# Altium footprint library BeaconBoard.PcbLib: 39 footprints (part 3 of 3)
Each footprint in its own frame and in the unit in brackets; x right, y up, seen from the top. Pads: shape width x height; smd on the part's side, far side on the other; paste and mask are expansions set on the pad; w line width, h text height; cw(c..) or ccw(c..) is an arc to the next point about the centre after c.
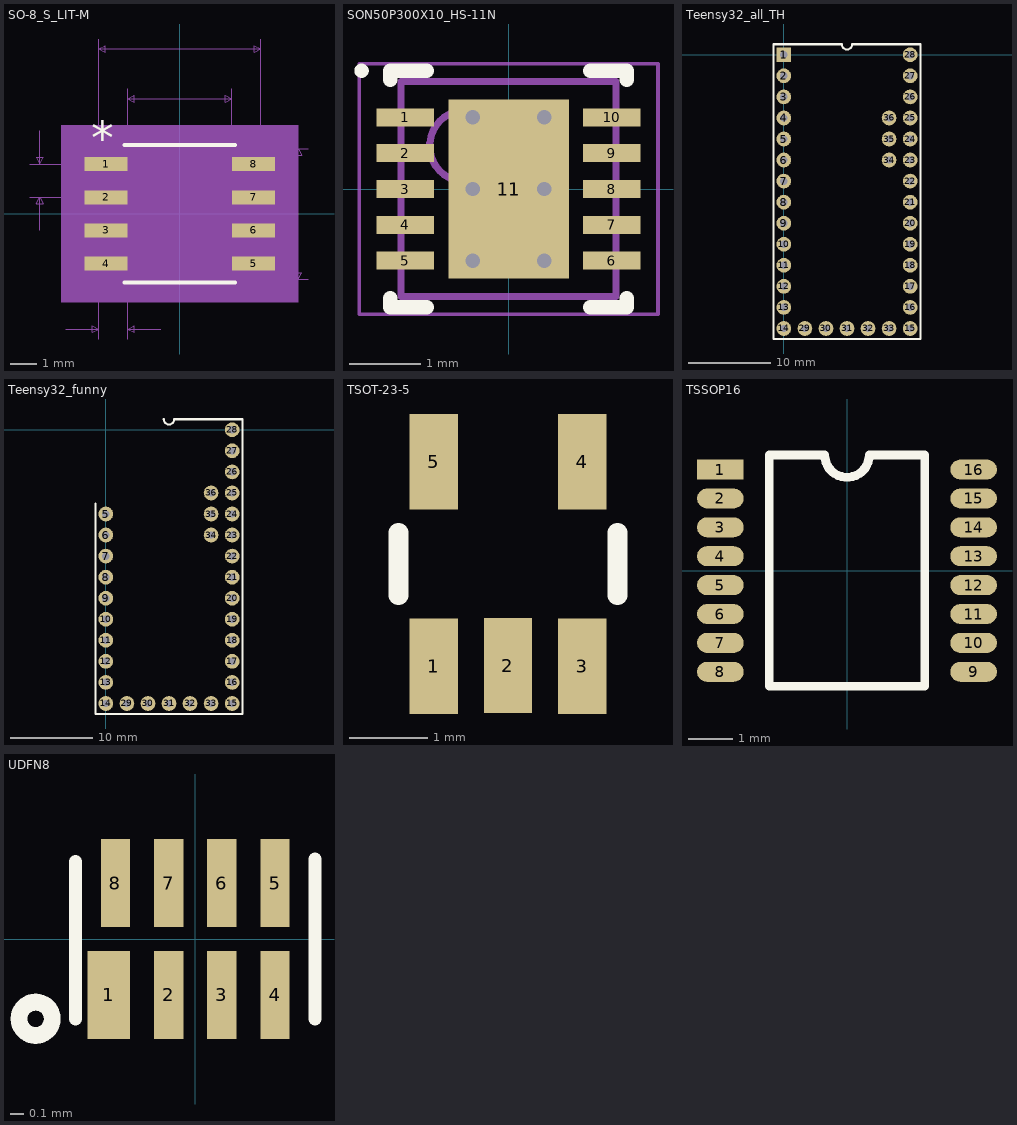
[diagram p2: the footprints below, top view; thin cyan lines are the x and y axes]

## SO-8_S_LIT-M [mm]
pads (8):
  rect 1.655x0.533 smd paste+0 mask+0: 1(-2.821,1.905) 2(-2.821,0.635) 3(-2.821,-0.635) 4(-2.821,-1.905) 5(2.821,-1.905) 6(2.821,-0.635) 7(2.821,0.635) 8(2.821,1.905)
Top Overlay:
  lines w0.152: -2.121,-2.629 2.121,-2.629 ; -2.121,2.629 2.121,2.629
  text "*" at -3.393,2.311 h1.27
Mechanical 5:
  region: 4.538,-3.391 -4.538,-3.391 -4.538,3.391 4.538,3.391
Mechanical 7:
  lines w0.025: -5.742,0.635 -2.821,0.635 ; -5.742,1.905 -2.821,1.905 ; -5.361,-0.635 -5.361,0.635 ; -5.361,3.175 -5.361,1.905 ; -4.369,-4.407 -3.099,-4.407 ; -3.099,-4.788 -3.099,0 -3.099,6.693 ; -1.994,-4.788 -1.994,0 -1.994,4.788 ; -0.724,-4.407 -1.994,-4.407 ; 0,-2.502 4.915,-2.502 ; 0,2.502 4.915,2.502 ; 1.994,0 1.994,4.788 ; 3.099,0 3.099,6.693 ; -5.361,0.635 -5.234,0.381 -5.488,0.381 -5.361,0.635 ; -5.361,1.905 -5.234,2.159 -5.488,2.159 -5.361,1.905 ; -3.099,-4.407 -3.353,-4.534 -3.353,-4.28 -3.099,-4.407 ; -3.099,6.312 -2.845,6.185 -2.845,6.439 -3.099,6.312 ; -3.099,6.312 3.099,6.312 ; -1.994,-4.407 -1.74,-4.534 -1.74,-4.28 -1.994,-4.407 ; -1.994,4.407 -1.74,4.28 -1.74,4.534 -1.994,4.407 ; -1.994,4.407 1.994,4.407 ; 1.994,4.407 1.74,4.28 1.74,4.534 1.994,4.407 ; 3.099,6.312 2.845,6.185 2.845,6.439 3.099,6.312 ; 4.534,-2.502 4.661,-2.248 4.407,-2.248 4.534,-2.502 ; 4.534,-2.502 4.534,2.502 ; 4.534,2.502 4.661,2.248 4.407,2.248 4.534,2.502
  text "0.05in/1.27mm" at -4.61,-5.55 h0.64
  text "0.05in/1.27mm" at -9.997,0.953 h0.64
  text "0.197in/5.004mm" at 5.042,-0.318 h0.64
  text "0.244in/6.198mm" at -2.381,6.82 h0.64
  text "0.157in/3.988mm" at -2.381,4.915 h0.64
  text "Alt 2 Padstyle: b229_152h76" at -8.572,-15.202 h1.27
  text "Alt 1 Padstyle: b152_229h76" at -8.572,-13.678 h1.27
  text "Pin One Padstyle: r165_53" at -7.938,-9.106 h1.27
  text "Default Padstyle: r165_53" at -7.938,-7.582 h1.27
Mechanical 13:
  lines w0: -0.305,2.502 ccw(c0,2.502) 0.305,2.502
  lines w0.025: -3.099,-2.146 -1.994,-2.146 -1.994,-1.664 -3.099,-1.664 -3.099,-2.146 ; -3.099,-0.876 -1.994,-0.876 -1.994,-0.394 -3.099,-0.394 -3.099,-0.876 ; -3.099,0.394 -1.994,0.394 -1.994,0.876 -3.099,0.876 -3.099,0.394 ; -3.099,1.664 -1.994,1.664 -1.994,2.146 -3.099,2.146 -3.099,1.664 ; -1.994,-2.502 -1.994,2.502 1.994,2.502 1.994,-2.502 -1.994,-2.502 ; 1.994,-2.146 3.099,-2.146 3.099,-1.664 1.994,-1.664 1.994,-2.146 ; 1.994,-0.876 3.099,-0.876 3.099,-0.394 1.994,-0.394 1.994,-0.876 ; 1.994,0.394 3.099,0.394 3.099,0.876 1.994,0.876 1.994,0.394 ; 1.994,1.664 3.099,1.664 3.099,2.146 1.994,2.146 1.994,1.664
  text "*" at -1.93,1.156 h1.27
Mechanical 15:
  region: -2.502,-2.679 -4.157,-2.679 -4.157,2.679 -2.502,2.679 -2.502,3.01 2.502,3.01 2.502,2.679 4.157,2.679 4.157,-2.679 2.502,-2.679 2.502,-3.01 -2.502,-3.01
  lines w0.152: -4.157,-2.679 -2.502,-2.679 -2.502,-3.01 2.502,-3.01 2.502,-2.679 4.157,-2.679 4.157,2.679 2.502,2.679 2.502,3.01 -2.502,3.01 -2.502,2.679 -4.157,2.679 -4.157,-2.679
3D body "SO-8_S_LIT.step": height 1.76, standoff 0, extent -3.099,-2.502 3.099,2.502
3D body: height 0.25, standoff 0, extent 0,0 0.254,0.254

## SON50P300X10_HS-11N [mm] "SON, 10-Leads, Body 3.00x3.00mm, Pitch 0.50mm, Thermal Pad 2.50x1.68mm, IPC Medium Density"
height 0.1
pads (11):
  rect 0.8x0.25 smd: 1(-1.44,1) 2(-1.44,0.5) 3(-1.44,0) 4(-1.44,-0.5) 5(-1.44,-1) 6(1.44,-1) 7(1.44,-0.5) 8(1.44,0) 9(1.44,0.5) 10(1.44,1)
  rect 1.68x2.5 smd: 11(0,0)
via 0.5,-1 diameter 0.5 hole 0.2
via -0.5,-1 diameter 0.5 hole 0.2
via 0.5,0 diameter 0.5 hole 0.2
via -0.5,0 diameter 0.5 hole 0.2
via 0.5,1 diameter 0.5 hole 0.2
via -0.5,1 diameter 0.5 hole 0.2
Top Overlay:
  circle w0.1: c-2.05,1.65 r0.05
  lines w0.2: -1.65,-1.525 -1.65,-1.65 -1.14,-1.65 ; -1.65,1.525 -1.65,1.65 -1.14,1.65 ; 1.14,-1.65 1.65,-1.65 1.65,-1.525 ; 1.14,1.65 1.65,1.65 1.65,1.525
Mechanical 13:
  circle w0.1: c-0.6,0.6 r0.5
  lines w0.1: -1.5,-1.5 1.5,-1.5 1.5,1.5 -1.5,1.5 -1.5,-1.5
Mechanical 15:
  lines w0.05: -2.085,-1.75 2.085,-1.75 2.085,1.75 -2.085,1.75 -2.085,-1.75
  lines w0.1: -0.5,0 0.5,0 ; 0,-0.5 0,0.5
3D body: height 0.75, standoff 0.05, extent -1.5,-1.5 1.5,1.5

## Teensy32_all_TH [mil]
pads (36):
  rect 70x70 hole 35: 1(0,0)
  round 70 hole 35: 2(0,-100) 3(0,-200) 4(0,-300) 5(0,-400) 6(0,-500) 7(0,-600) 8(0,-700) 9(0,-800) 10(0,-900) 11(0,-1000) 12(0,-1100) 13(0,-1200) 14(0,-1300) 15(600,-1300) 16(600,-1200) 17(600,-1100) 18(600,-1000) 19(600,-900) 20(600,-800) 21(600,-700) 22(600,-600) 23(600,-500) 24(600,-400) 25(600,-300) 26(600,-200) 27(600,-100) 28(600,0) 29(100,-1300) 30(200,-1300) 31(300,-1300) 32(400,-1300) 33(500,-1300) 34(500,-500) 35(500,-400) 36(500,-300)
Top Overlay:
  lines w10: -50,-1350 -50,50 275,50 ccw(c300,50) 325,50 650,50 650,-1350 -50,-1350
3D body "Teensy_3-2.stp": height 172.87, standoff -78.74, extent -50,-1350 653.72,106.67

## Teensy32_funny [mil]
pads (32):
  round 70 hole 35: 5(0,-400) 6(0,-500) 7(0,-600) 8(0,-700) 9(0,-800) 10(0,-900) 11(0,-1000) 12(0,-1100) 13(0,-1200) 14(0,-1300) 15(600,-1300) 16(600,-1200) 17(600,-1100) 18(600,-1000) 19(600,-900) 20(600,-800) 21(600,-700) 22(600,-600) 23(600,-500) 24(600,-400) 25(600,-300) 26(600,-200) 27(600,-100) 28(600,0) 29(100,-1300) 30(200,-1300) 31(300,-1300) 32(400,-1300) 33(500,-1300) 34(500,-500) 35(500,-400) 36(500,-300)
Top Overlay:
  lines w10: -50,-350 -50,-1350 650,-1350 650,50 325,50 cw(c300,50) 275,50
3D body "Teensy_3-2.stp": height 502.87, standoff 251.26, extent -50,-1350 653.72,106.67

## TSOT-23-5 [mm] "TSOT-23-5"
pads (5):
  rect 0.62x1.22 smd: 1(-1270.95,-1271.31) 2(-1270,-1271.3) 3(-1269.05,-1271.31) 4(-1269.05,-1268.69) 5(-1270.95,-1268.69)
Top Overlay:
  lines w0.254: -1271.4,-1270.4 -1271.4,-1269.6 ; -1268.6,-1270.4 -1268.6,-1269.6
3D body "TSOT-23-5.STEP": height 0.94, standoff -0.02, extent -1271.45,-1271.595 -1268.55,-1268.405

## TSSOP16 [mm]
pads (16):
  rect 1.05x0.45 smd: 1(-2.85,2.275)
  oval 1.05x0.45 smd: 2(-2.85,1.625) 3(-2.85,0.975) 4(-2.85,0.325) 5(-2.85,-0.325) 6(-2.85,-0.975) 7(-2.85,-1.625) 8(-2.85,-2.275) 9(2.85,-2.275) 10(2.85,-1.625) 11(2.85,-0.975) 12(2.85,-0.325) 13(2.85,0.325) 14(2.85,0.975) 15(2.85,1.625) 16(2.85,2.275)
Top Overlay:
  lines w0.2: -1.75,-2.6 -1.75,2.6 -0.5,2.6 ccw(c0,2.6) 0.5,2.6 1.75,2.6 1.75,-2.6 -1.75,-2.6
3D body "TSSOP16.step": height 1.09, standoff 0, extent -3.14,-2.5 3.14,2.5

## UDFN8 [mm]
height 0.37
pads (8):
  rect 0.32x0.66 smd mask+0.05: 1(-0.65,-0.42)
  rect 0.22x0.66 smd mask+0.05: 2(-0.2,-0.42) 3(0.2,-0.42) 4(0.6,-0.42) 5(0.6,0.42) 6(0.2,0.42) 7(-0.2,0.42) 8(-0.6,0.42)
Top Overlay:
  lines w0.1: -0.9,-0.6 -0.9,0.58 ; 0.9,-0.6 0.9,0.6
  lines w0.127: -1.325,-0.6 ccw(c-1.2,-0.6) -1.325,-0.599
3D body "UDFN8_1P20X1P80_ONS.step": height 0.56, standoff 0, extent -0.902,-0.597 0.902,0.597